# Altium footprint library PcbLib.PcbLib: 116 footprints (part 3 of 8)
Each footprint in its own frame and in the unit in brackets; x right, y up, seen from the top. Pads: shape width x height; smd on the part's side, far side on the other; paste and mask are expansions set on the pad; w line width, h text height; cw(c..) or ccw(c..) is an arc to the next point about the centre after c.
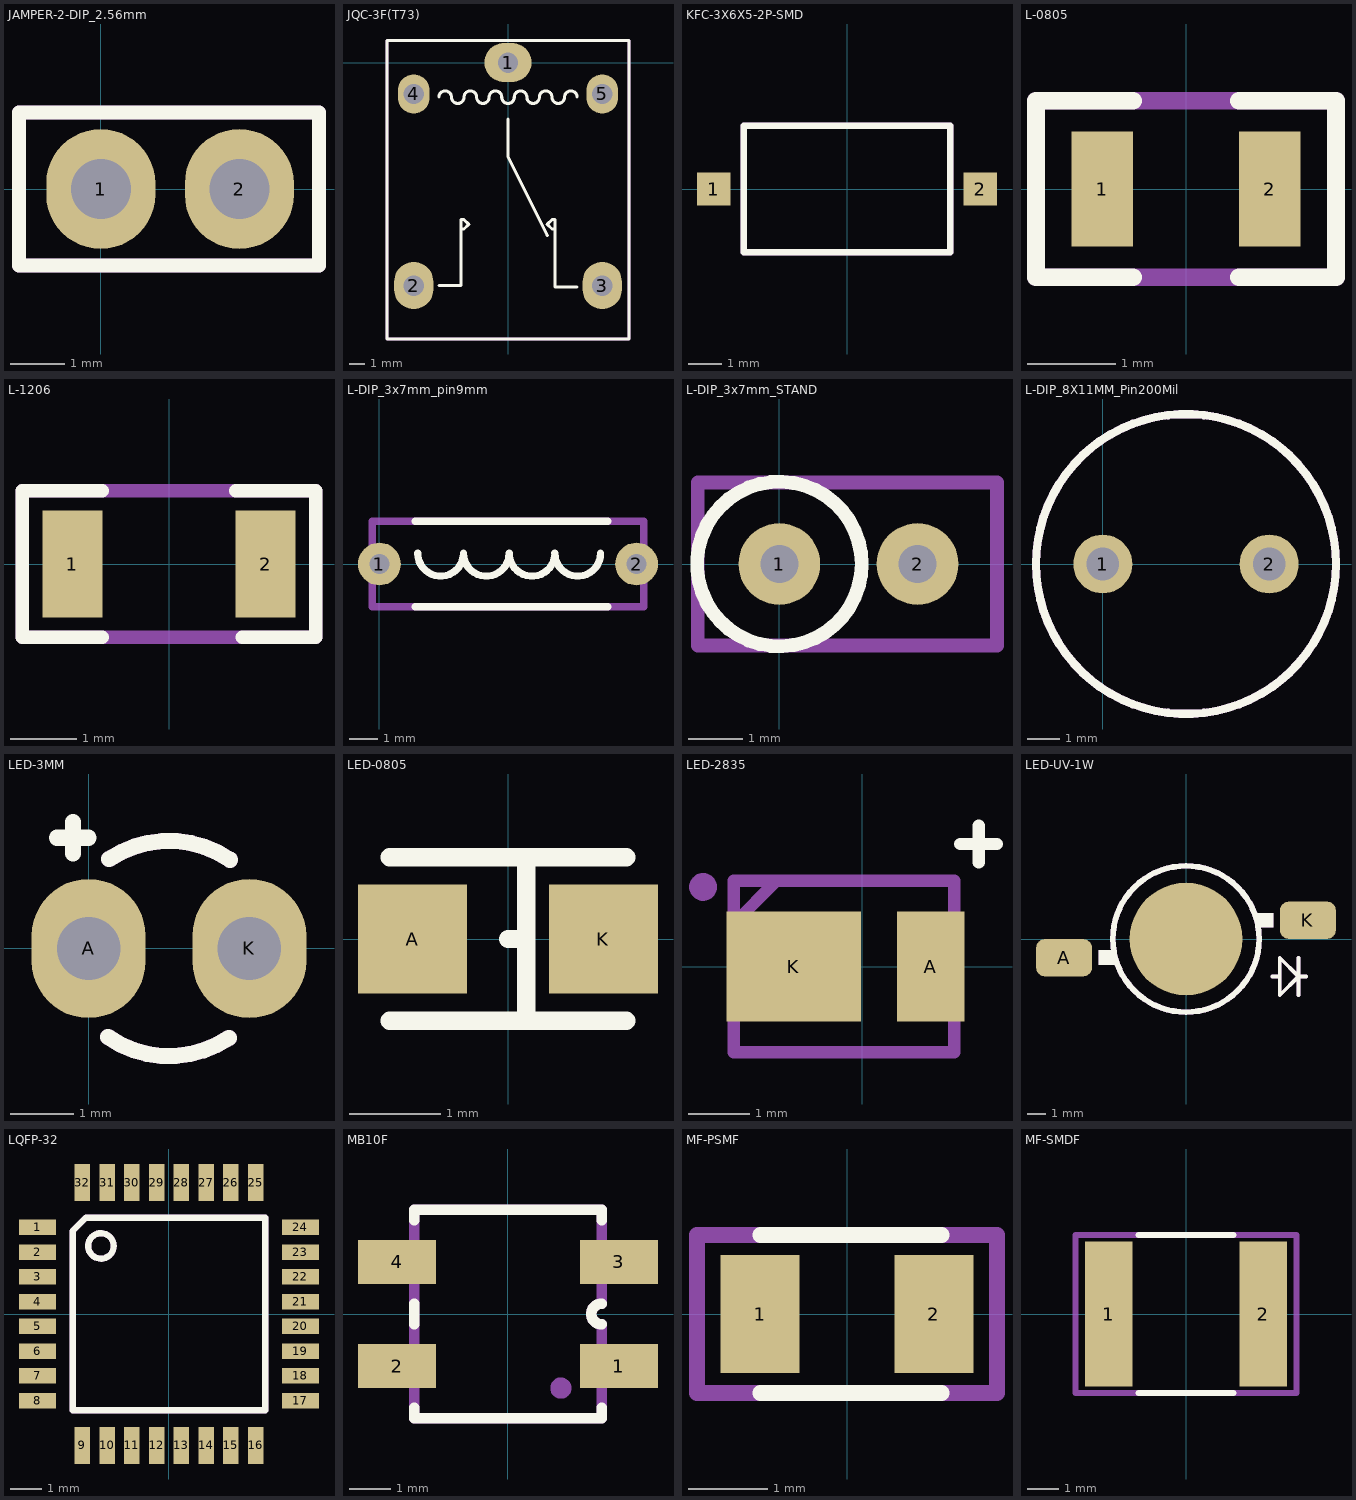
[diagram p2: the footprints below, top view; thin cyan lines are the x and y axes]

## JAMPER-2-DIP_2.56mm [mm]
pads (2):
  oval 2x2.2 hole 1.1 mask+0.102: 1(0,0) 2(2.54,0)
Top Overlay:
  lines w0.254: -1.5,-1.4 -1.5,-0.7 -1.5,0.7 -1.5,1.4 4,1.4 4,-1.4 -1.5,-1.4
Mechanical 29:
  lines w0.254: -1.5,-1.4 -1.5,-0.7 -1.5,0.7 -1.5,1.4 4,1.4 4,-1.4 -1.5,-1.4
  text ".Designator" at 0.1,-0.467 h1
3D body "Jumper2.step": height 8.7, standoff -2.9, extent -1.33,-1.27 3.87,1.27

## JQC-3F(T73) [mm]
pads (5):
  oval 3x2.5 hole 1.3 paste+0 mask+0.04: 1(0,0)
  oval 2.5x3 hole 1.3 paste+0 mask+0.04: 2(-6,-14.2) 3(6,-14.2)
  oval 2x2.5 hole 1.3 paste+0 mask+0.04: 4(-6,-2) 5(6,-2)
Top Overlay:
  lines w0.2: -4.4,-14.2 -3,-14.2 -3,-10 -2.8,-10 -2.5,-10.3 -2.8,-10.6 -3,-10.6 ; -4.4,-2.2 cw(c-4,-2.2) -3.6,-2.2 ccw(c-3.2,-2.2) -2.8,-2.2 cw(c-2.4,-2.2) -2,-2.2 ccw(c-1.6,-2.2) -1.2,-2.2 cw(c-0.8,-2.2) -0.4,-2.2 ccw(c0,-2.2) 0.4,-2.2 cw(c0.8,-2.2) 1.2,-2.2 ccw(c1.6,-2.2) 2,-2.2 cw(c2.4,-2.2) 2.8,-2.2 ccw(c3.2,-2.2) 3.6,-2.2 cw(c4,-2.2) 4.4,-2.2 ; 0,-3.6 0,-6 2.5,-11 ; 3,-10.6 2.8,-10.6 2.5,-10.3 2.8,-10 3,-10 3,-12 3,-14.3 4.4,-14.3 ; -7.7,-17.6 7.7,-17.6 7.7,1.4 -7.7,1.4 -7.7,-17.6
Mechanical 29:
  lines w0.2: -7.7,-17.6 7.7,-17.6 7.7,1.4 -7.7,1.4 -7.7,-17.6
  text ".Designator" at -2.8,-8.467 h1
3D body "Relay - JQC-3F(T73) - 5V.stp": height 14.94, standoff -3.61, extent -7.544,-17.447 7.544,1.247

## KFC-3X6X5-2P-SMD [mm]
pads (2):
  rect 1x1 smd: 1(-4,0) 2(4,0)
Top Overlay:
  lines w0.2: -3.1,-1.9 -3.1,1.9 3.1,1.9 3.1,-1.9 -3.1,-1.9
Mechanical 29:
  lines w0.2: -3.1,-1.9 -3.1,1.9 3.1,1.9 3.1,-1.9 -3.1,-1.9
  text ".Designator" at -0.8,-0.467 h1
3D body "btn.STEP": height 5, standoff 0, extent -4.5,-1.775 4.5,1.775

## L-0805 [mm]
pads (2):
  rect 0.7x1.3 smd: 1(-0.95,0) 2(0.95,0)
Top Overlay:
  lines w0.2: -0.6,-1 -1.7,-1 -1.7,1 -0.6,1 ; 0.6,-1 1.7,-1 1.7,1 0.6,1
Mechanical 29:
  lines w0.2: -1.7,-1 -1.7,1 1.7,1 1.7,-1 -1.7,-1
  text ".Designator" at -1.05,-0.467 h1
3D body "User Library-ind_0805.step": height 0.95, standoff 0, extent -1.1,-0.6 0.9,0.6

## L-1206 [mm]
pads (2):
  rect 0.9x1.6 smd: 1(-1.45,0) 2(1.45,0)
Top Overlay:
  lines w0.2: -1,-1.1 -2.2,-1.1 -2.2,1.1 -1,1.1 ; 1,1.1 2.2,1.1 2.2,-1.1 1.1,-1.1
Mechanical 29:
  lines w0.2: -2.2,-1.1 -2.2,1.1 2.2,1.1 2.2,-1.1 -2.2,-1.1
  text ".Designator" at -1.05,-0.217 h1
3D body "74479157.stp": height 1.1, standoff 0, extent -1.6,-0.8 1.6,0.8

## L-DIP_3x7mm_pin9mm [mm]
pads (2):
  round 1.5 hole 0.7 mask+0.102: 1(0,0) 2(9,0)
Top Overlay:
  lines w0.254: 1.25,-1.5 8,-1.5 ; 1.25,1.5 8,1.5 ; 1.341,0.375 ccw(c2.141,0.375) 2.941,0.375 ccw(c3.741,0.375) 4.541,0.375 ccw(c5.341,0.375) 6.141,0.375 ccw(c6.941,0.375) 7.741,0.375
Mechanical 29:
  lines w0.254: -0.25,-1.5 9.25,-1.5 9.25,1.5 -0.25,1.5 -0.25,-1.5
  text ".Designator" at 2.45,-0.217 h1
3D body "Part1.STEP": height 3.5, standoff -0.91, extent -0.25,-1.5 9.25,1.5

## L-DIP_3x7mm_STAND [mm]
pads (2):
  round 1.5 hole 0.7 mask+0.102: 1(0,0) 2(2.54,0)
Top Overlay:
  circle w0.254: c0,0 r1.513
Mechanical 29:
  lines w0.254: -1.5,-1.5 4,-1.5 4,1.5 -1.5,1.5 -1.5,-1.5
  text ".Designator" at 0.5,-0.267 h1
3D body "Part1.STEP": height 8.09, standoff -0.9, extent -1.499,-1.499 2.803,1.499

## L-DIP_8X11MM_Pin200Mil [mm]
pads (2):
  round 1.8 hole 1: 1(0,0) 2(5.08,0)
Top Overlay:
  circle w0.254: c2.54,0 r4.579
Mechanical 29:
  circle w0.254: c2.54,0 r4.579
  text ".Designator" at 3.023,-0.816 h1
3D body "Part2.STEP": height 11.3, standoff -4.5, extent -1.96,-4.5 7.04,4.5

## LED-3MM [mm]
pads (2):
  oval 1.8x2.2 hole 1: A(0,0)
  oval 1.8x2.2 hole 1 mask+0.102: K(2.54,0)
Top Overlay:
  lines w0.254: -0.5,1.75 0,1.75 ; -0.25,1.5 -0.25,2 ; 0.308,-1.402 ccw(c1.27,0) 2.216,-1.413 ; 0.324,1.413 cw(c1.27,0) 2.232,1.402
Mechanical 29:
  lines w0.254: 0.308,-1.402 ccw(c1.27,0) 2.216,-1.413 ; 0.324,1.413 cw(c1.27,0) 2.232,1.402
  text ".Designator" at -0.55,-0.392 h1
3D body "LED 3mm RED.STEP": height 9.5, standoff -21, extent -0.33,-1.6 2.87,1.6

## LED-0805 [mm]
pads (2):
  rect 1.2x1.2 smd: A(-1.05,0) K(1.05,0)
Top Overlay:
  lines w0.2: -1.3,-0.9 1.3,-0.9 ; -1.3,0.9 1.3,0.9 ; 0,0 0.2,0 ; 0.2,-0.9 0.2,0.9
3D body "User Library-CHIPLED-0805.step": height 0.93, standoff 0.02, extent -1.05,-0.675 1.05,0.675

## LED-2835 [mm]
pads (2):
  rect 1.1x1.8 smd: A(1.12,0)
  rect 2.2x1.8 smd: K(-1.12,0)
Top Overlay:
  lines w0.2: 1.6,2 2.2,2 ; 1.9,1.7 1.9,2.3
Mechanical 29:
  circle w0.254: c-2.6,1.3 r0.1
  lines w0.2: -2.1,0.7 -1.4,1.4 ; -1.4,1.4 -1.4,1.4 ; -2.1,-1.4 -2.1,1.4 1.5,1.4 1.5,-1.4 -0.5,-1.4 -2.1,-1.4 ; -1.6,1.4 -1.6,1.4
  text ".Designator" at -1.4,-0.367 h1
3D body "User Library-LED 2835.step": height 0.72, standoff 0, extent -2.038,-1.4 1.474,1.4

## LED-UV-1W [mm]
pads (3):
  rrect50% 3x2 smd: A(-6.5,-1) K(6.5,1)
  round 6 smd: ""(0,0)
Top Overlay:
  circle w0.3: c0,0 r3.9
  region: -3.7,-0.6 -4.663,-0.6 -4.663,-1.4 -3.7,-1.4
  region: 4.663,1.4 3.7,1.4 3.7,0.6 4.663,0.6
  lines w0.2: 4.6,-2 5,-2 ; 6,-3 6,-1 ; 6.4,-2 6,-2 ; 6,-2 5,-3 5,-1 6,-2
Mechanical 29:
  circle w0.3: c0,0 r3.9
  region: -3.7,-0.6 -4.663,-0.6 -4.663,-1.4 -3.7,-1.4
  region: 4.663,1.4 3.7,1.4 3.7,0.6 4.663,0.6
  lines w0.2: 4.6,-2 5,-2 ; 6,-3 6,-1 ; 6.4,-2 6,-2 ; 6,-2 5,-3 5,-1 6,-2
  text ".Designator" at -1,-0.367 h1
3D body "Power Led.stp": height 4.8, standoff -0.25, extent -7.3,-3.975 7.6,3.975

## LQFP-32 [mm]
pads (32):
  rect 1.2x0.5 smd: 1(-4.25,2.8) 2(-4.25,2) 3(-4.25,1.2) 4(-4.25,0.4) 5(-4.25,-0.4) 6(-4.25,-1.2) 7(-4.25,-2) 8(-4.25,-2.8) 17(4.25,-2.8) 18(4.25,-2) 19(4.25,-1.2) 20(4.25,-0.4) 21(4.25,0.4) 22(4.25,1.2) 23(4.25,2) 24(4.25,2.8)
  rect 0.5x1.2 smd: 9(-2.8,-4.25) 10(-2,-4.25) 11(-1.2,-4.25) 12(-0.4,-4.25) 13(0.4,-4.25) 14(1.2,-4.25) 15(2,-4.25) 16(2.8,-4.25) 25(2.8,4.25) 26(2,4.25) 27(1.2,4.25) 28(0.4,4.25) 29(-0.4,4.25) 30(-1.2,4.25) 31(-2,4.25) 32(-2.8,4.25)
Top Overlay:
  circle w0.2: c-2.2,2.2 r0.412
  lines w0.2: -3.115,-3.115 -3.115,2.685 -2.685,3.115 3.115,3.115 3.115,-3.115 -3.115,-3.115
Mechanical 29:
  circle w0.2: c-2.2,2.2 r0.412
  lines w0.2: -3.115,-3.115 -3.115,2.685 -2.685,3.115 3.115,3.115 3.115,-3.115 -3.115,-3.115
  text ".Designator" at -0.8,-0.367 h1
3D body "User Library-sot358-1.STEP": height 1.43, standoff -0.03, extent -4.539,-4.539 4.54,4.539

## MB10F [mm]
pads (4):
  rect 1.875x1.05 smd: 1(2.663,-1.25) 2(-2.662,-1.25) 3(2.663,1.25) 4(-2.662,1.25)
Top Overlay:
  lines w0.254: -2.25,-2.25 -2.25,-2.5 2.25,-2.5 2.25,-2.25 ; -2.25,-0.25 -2.25,0.25 ; -2.25,2.25 -2.25,2.5 2.25,2.5 2.25,2.25 ; 2.25,-0.25 cw(c2.25,0) 2.25,0.25
Mechanical 29:
  circle w0.254: c1.27,-1.778 r0.127
  lines w0.254: -2.25,-2.5 2.25,-2.5 2.25,-0.25 cw(c2.25,0) 2.25,0.25 2.25,2.5 -2.25,2.5 -2.25,-2.5
  text ".Designator" at -0.276,1.041 h1
3D body "MB10F TMBS.step": height 1.62, standoff 0.01, extent -3.463,-2.4 3.338,2.5

## MF-PSMF [mm]
pads (2):
  rect 1x1.5 smd: 1(-1.1,0) 2(1.1,0)
Top Overlay:
  lines w0.2: -1.1,-1 1.2,-1 ; -1.1,1 1.2,1
Mechanical 29:
  lines w0.2: -1.9,-1 -1.9,1 1.9,1 1.9,-1 -1.9,-1
  text ".Designator" at -1.2,-0.367 h1
3D body "Part2.STEP": height 0.86, standoff -0.01, extent -1.15,-0.75 1.15,0.75

## MF-SMDF [mm]
pads (2):
  rect 1.5x4.6 smd: 1(-2.45,0) 2(2.45,0)
Top Overlay:
  lines w0.2: -1.5,-2.5 1.5,-2.5 ; -1.5,2.5 1.5,2.5
Mechanical 29:
  circle w0.2: c-2.5,0 r0.1
  lines w0.2: -3.5,-2.5 -3.5,2.5 3.5,2.5 3.5,-2.5 -3.5,-2.5
  text ".Designator" at -0.8,-0.467 h1
3D body "User Library-MF-SMDF150-2.step": height 1, standoff 0.05, extent -2.7,-2.45 2.7,2.45